# Altium footprint library PCBLIB.PcbLib: 775 footprints (part 47 of 49)
Each footprint in its own frame and in the unit in brackets; x right, y up, seen from the top. Pads: shape width x height; smd on the part's side, far side on the other; paste and mask are expansions set on the pad; w line width, h text height; cw(c..) or ccw(c..) is an arc to the next point about the centre after c.
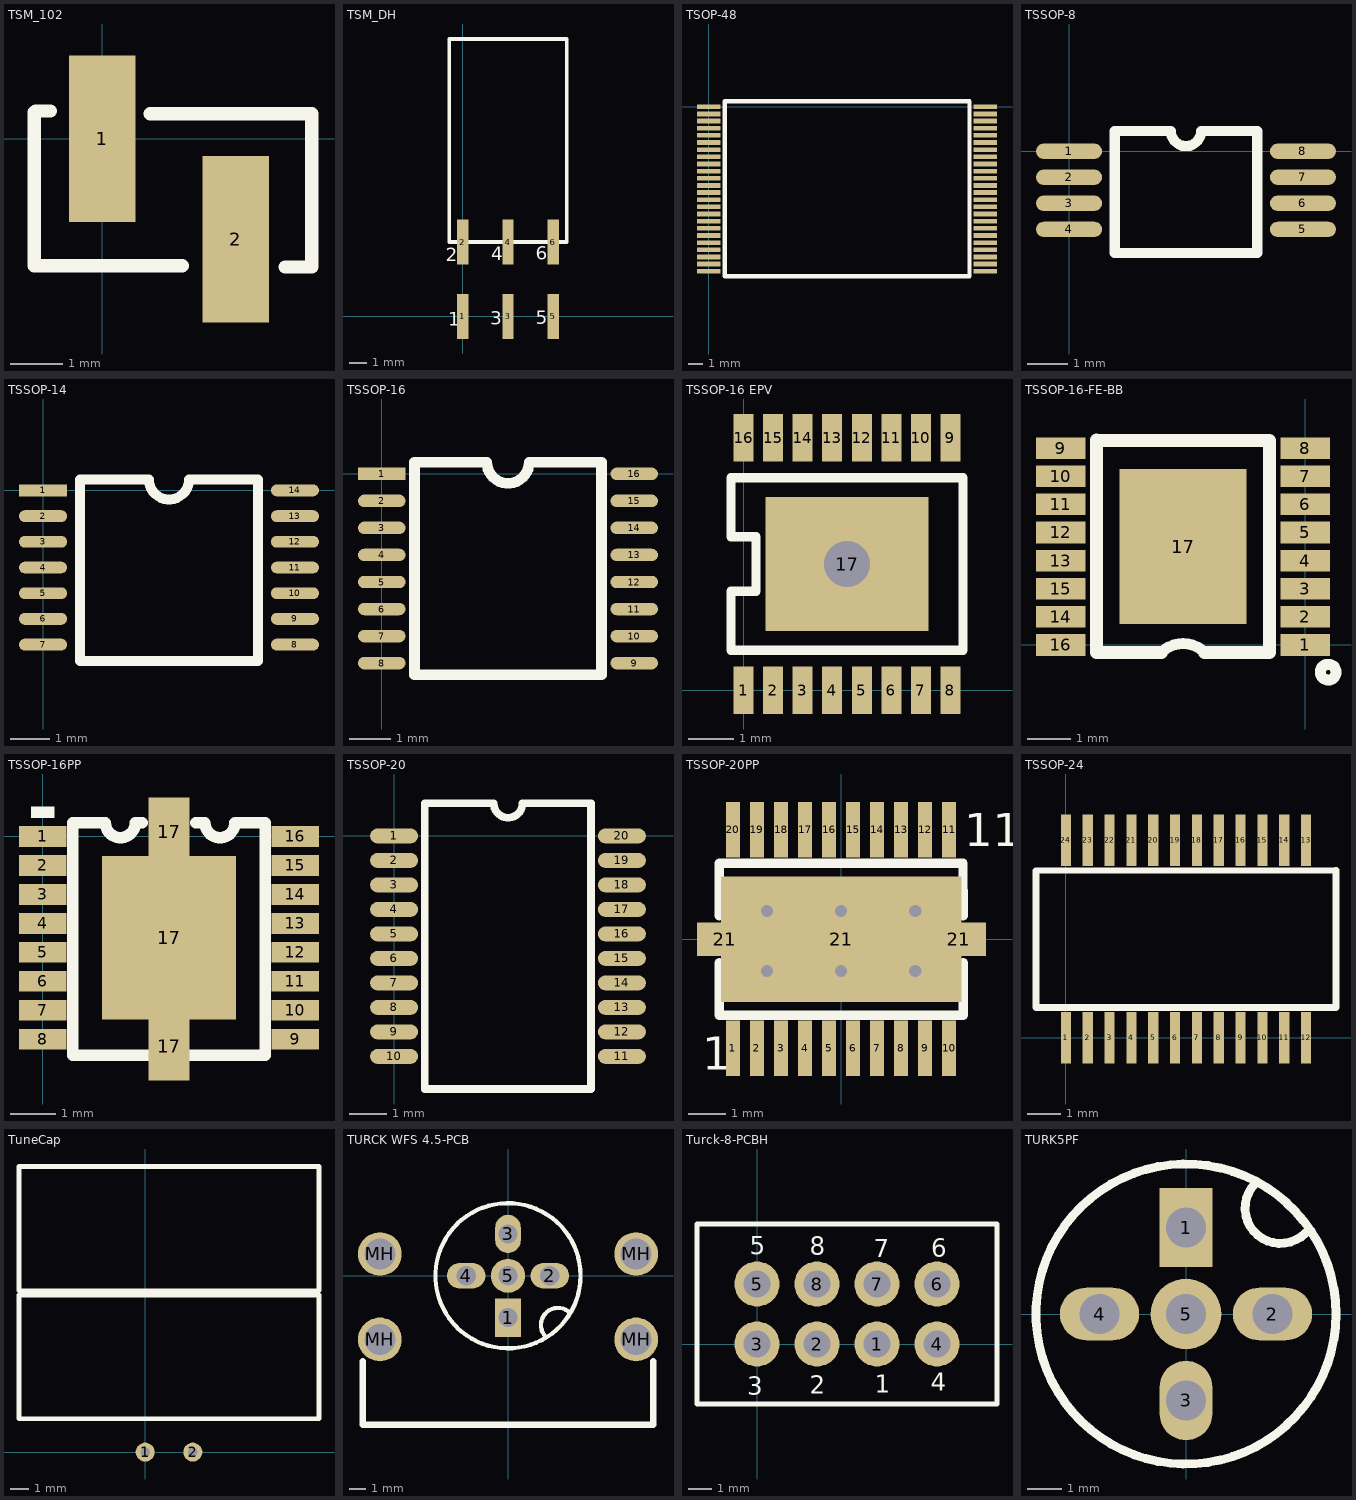
[diagram p46: the footprints below, top view; thin cyan lines are the x and y axes]

## TSM_102 [mm]
height 6.706
pads (2):
  rect 1.27x3.17 smd: 1(0,0) 2(2.54,-1.905)
TopOverlay:
  lines w0.254: -0.991,0.533 -1.27,0.533 -1.295,0.508 -1.295,-2.413 1.524,-2.413 ; 0.914,0.483 3.988,0.483 3.988,-2.438 3.48,-2.438
  text "." at -1.372,1.295 h1.78

## TSM_DH [mil]
height 150
pads (6):
  rect 25x100 smd: 1(0,0) 2(0,165) 3(100,0) 4(100,165) 5(200,0) 6(200,165)
TopOverlay:
  lines w8: -30,165 -30,615 230,615 230,165 -30,165
  text "1" at -32,-20.5 h30
  text "2" at -38,122.5 h30
  text "3" at 61,-18.5 h30
  text "4" at 63,124.5 h30
  text "5" at 161,-17.5 h30
  text "6" at 162,125.5 h30

## TSOP-48 [mil]
height 80
pads (48):
  rect 65x13 smd: 1(0,0) 2(0,-19.68) 3(0,-39.37) 4(0,-59.06) 5(0,-78.74) 6(0,-98.43) 7(0,-118.11) 8(0,-137.8) 9(0,-157.48) 10(0,-177.17) 11(0,-196.85) 12(0,-216.54) 13(0,-236.22) 14(0,-255.91) 15(0,-275.59) 16(0,-295.28) 17(0,-314.96) 18(0,-334.65) 19(0,-354.33) 20(0,-374.02) 21(0,-393.7) 22(0,-413.39) 23(0,-433.07) 24(0,-452.76) 25(760.71,-452.76) 26(760.71,-433.07) 27(760.71,-413.39) 28(760.71,-393.7) 29(760.71,-374.02) 30(760.71,-354.33) 31(760.71,-334.65) 32(760.71,-314.96) 33(760.71,-295.28) 34(760.71,-275.59) 35(760.71,-255.91) 36(760.71,-236.22) 37(760.71,-216.54) 38(760.71,-196.85) 39(760.71,-177.17) 40(760.71,-157.48) 41(760.71,-137.8) 42(760.71,-118.11) 43(760.71,-98.43) 44(760.71,-78.74) 45(760.71,-59.06) 46(760.71,-39.37) 47(760.71,-19.68) 48(760.71,0)
TopOverlay:
  lines w12: 43.52,-466.3 717.52,-466.3 717.52,14.7 43.52,14.7 43.52,-466.3
  text "." at 74.52,-24.3 h80

## TSSOP-8 [mil]
height 45
pads (8):
  oval 65x15 smd mask+2: 1(0,0) 2(0,-25.6) 3(0,-51.2) 4(0,-76.8) 5(230,-76.8) 6(230,-51.2) 7(230,-25.6) 8(230,0)
TopOverlay:
  lines w10: 45,-100 45,20 100,20 ccw(c115,20) 130,20 185,20 185,-100 45,-100

## TSSOP-14 [mil]
height 100
pads (14):
  rect 48x11.8 smd: 1(0,0)
  oval 48x11.8 smd: 2(0,-25.6) 3(0,-51.2) 4(0,-76.8) 5(0,-102.4) 6(0,-128) 7(0,-153.6) 8(251,-153.6) 9(251,-128) 10(251,-102.4) 11(251,-76.8) 12(251,-51.2) 13(251,-25.6) 14(251,0)
TopOverlay:
  lines w10: 37,-170 214,-170 ; 37,-169.6 37,11 105.5,11 ccw(c125.5,11) 145.5,11 214,11 214,-169.6
Mechanical4:
  text ".040" at 0,0 h1

## TSSOP-16 [mil]
height 65
pads (16):
  rect 45x11.8 smd: 1(0,0)
  oval 45x11.8 smd: 2(0,-25.6) 3(0,-51.2) 4(0,-76.8) 5(0,-102.4) 6(0,-128) 7(0,-153.6) 8(0,-179.2) 9(239,-179.2) 10(239,-153.6) 11(239,-128) 12(239,-102.4) 13(239,-76.8) 14(239,-51.2) 15(239,-25.6) 16(239,0)
TopOverlay:
  lines w10: 31,-190 31,11 99.5,11 ccw(c119.5,11) 139.5,11 208,11 208,-190 31,-190
Mechanical4:
  text ".040" at -6,0 h1

## TSSOP-16 EPV [mm]
pads (17):
  rect 0.44x1.05 smd: 1(0,0) 2(0.65,0) 3(1.3,0) 4(1.95,0) 5(2.6,0) 6(3.25,0) 7(3.9,0) 8(4.55,0) 9(4.55,5.55) 10(3.9,5.55) 11(3.25,5.55) 12(2.6,5.55) 13(1.95,5.55) 14(1.3,5.55) 15(0.65,5.55) 16(0,5.55)
  rect 3.58x2.95 hole 1.016: 17(2.275,2.775)
TopOverlay:
  lines w0.203: -0.275,0.875 -0.275,2.175 0.275,2.175 0.275,3.375 -0.275,3.375 -0.275,4.675 4.825,4.675 4.825,0.875 -0.275,0.875
TopPaste:
  rectangle: 0.484,1.295 4.066,4.25

## TSSOP-16-FE-BB [mm]
pads (17):
  rect 1.15x0.5 smd: 1(0,0) 2(0,0.65) 3(0,1.3) 4(0,1.95) 5(0,2.6) 6(0,3.25) 7(0,3.9) 8(0,4.55) 9(-5.65,4.55) 10(-5.65,3.9) 11(-5.65,3.25) 12(-5.65,2.6) 13(-5.65,1.95) 14(-5.65,0.65) 15(-5.65,1.3) 16(-5.65,0)
  rect 2.94x3.58 smd: 17(-2.825,2.276)
TopOverlay:
  circle w0.254: c0.53,-0.628 r0.181
  lines w0.254: -3.325,-0.175 cw(c-2.825,-0.675) -2.325,-0.175
  lines w0.3: -4.826,4.725 -0.824,4.725 -0.824,-0.175 -2.325,-0.175 ; -4.826,4.74 -4.826,-0.175 -3.325,-0.175

## TSSOP-16PP [mil]
height 120
pads (19):
  rect 41x18 smd: 1(0,0) 2(0,-25) 3(0,-50) 4(0,-75) 5(0,-100) 6(0,-125) 7(0,-150) 8(0,-175) 9(218,-175) 10(218,-150) 11(218,-125) 12(218,-100) 13(218,-75) 14(218,-50) 15(218,-25) 16(218,0)
  rect 35.43x59.05 smd: 17(109,-181) 17(109,4)
  rect 115.98x140.98 smd: 17(109.02,-87.48)
TopOverlay:
  rectangle: -10,16 10,26
  lines w10: 86,12 80,12 cw(c67,12) 54,12 26,12 26,-189 192,-189 192,12 166,12 cw(c153,12) 140,12 132,12

## TSSOP-20 [mm]
height 3.048
pads (20):
  oval 1.27x0.4 smd: 1(0,0) 2(0,-0.65) 3(0,-1.3) 4(0,-1.95) 5(0,-2.6) 6(0,-3.25) 7(0,-3.9) 8(0,-4.55) 9(0,-5.2) 10(0,-5.85) 11(6.044,-5.85) 12(6.044,-5.2) 13(6.044,-4.55) 14(6.044,-3.9) 15(6.044,-3.25) 16(6.044,-2.6) 17(6.044,-1.95) 18(6.044,-1.3) 19(6.044,-0.65) 20(6.044,0)
TopOverlay:
  lines w0.203: 0.813,-6.716 0.813,0.864 ; 0.815,-6.716 5.226,-6.716 ; 0.815,0.864 2.645,0.864 ccw(c3.026,0.864) 3.407,0.864 5.226,0.864 ; 5.223,-6.716 5.223,0.864

## TSSOP-20PP [mm] "TI"
height 3.048
pads (23):
  rect 0.38x1.5 smd: 1(-2.927,-2.946) 2(-2.277,-2.946) 3(-1.627,-2.946) 4(-0.977,-2.946) 5(-0.327,-2.946) 6(0.323,-2.946) 7(0.973,-2.946) 8(1.623,-2.946) 9(2.273,-2.946) 10(2.923,-2.946) 11(2.923,2.954) 12(2.273,2.954) 13(1.623,2.954) 14(0.973,2.954) 15(0.323,2.954) 16(-0.327,2.954) 17(-0.977,2.954) 18(-1.627,2.954) 19(-2.277,2.954) 20(-2.927,2.954)
  rect 1.5x0.9 smd: 21(-3.15,0) 21(3.175,0)
  rect 6.5x3.4 smd: 21(0,0)
via 2.007,-0.864 diameter 0.762 hole 0.33
via 2.007,0.762 diameter 0.762 hole 0.33
via 0,-0.864 diameter 0.762 hole 0.33
via 0,0.762 diameter 0.762 hole 0.33
via -2.007,-0.864 diameter 0.762 hole 0.33
via -2.007,0.762 diameter 0.762 hole 0.33
TopOverlay:
  lines w0.254: -3.302,-0.635 -3.302,-2.057 3.298,-2.057 ; -3.302,0.635 -3.302,2.057 3.298,2.057 3.302,0.635 ; 3.302,-2.057 3.302,-0.635
  text "1" at -3.759,-3.531 h0.89
  text "11" at 3.327,2.515 h0.89

## TSSOP-24 [mm]
height 0.127
pads (24):
  rect 0.3x1.524 smd: 1(0,0) 2(0.65,0) 3(1.3,0) 4(1.95,0) 5(2.6,0) 6(3.25,0) 7(3.9,0) 8(4.55,0) 9(5.2,0) 10(5.85,0) 11(6.5,0) 12(7.15,0) 13(7.15,5.88) 14(6.5,5.88) 15(5.85,5.88) 16(5.2,5.88) 17(4.55,5.88) 18(3.9,5.88) 19(3.25,5.88) 20(2.6,5.88) 21(1.95,5.88) 22(1.3,5.88) 23(0.65,5.88) 24(0,5.88)
TopOverlay:
  lines w0.203: 8.039,4.984 8.039,0.902 -0.889,0.902 -0.889,4.973 8.039,4.986
  text "." at 0.113,1.318 h1.52

## TuneCap [mil]
pads (2):
  round 40 hole 20: 1(0,0) 2(100,0)
TopOverlay:
  lines w10: -265,70 365,70 365,330 -265,330 -265,70 ; -265,339 365,339 365,600 -265,600 -265,339

## TURCK WFS 4.5-PCB [mil]
pads (9):
  rect 60x90 hole 45: 1(0,-97.99)
  oval 90x60 hole 45: 2(97.99,0) 4(-97.99,0)
  oval 60x90 hole 45: 3(0,98)
  round 80 hole 45: 5(0,0)
  round 102.36 hole 73: MH(-300,-149) MH(-300,51) MH(300,-149) MH(300,51)
TopOverlay:
  circle w10: c0,0 r170
  lines w10: 88.94,-143.47 cw(c117.22,-115.19) 145.5,-86.91
  lines w15: -340,-200 -340,-349 340,-349 340,-200
Mechanical4:
  text "1.083" at 0,0 h1
  text "1.370" at -98,0 h1

## Turck-8-PCBH [mil] "90degree Turck Connector"
height 10
pads (8):
  round 75 hole 45: 1(200,0) 2(100,0) 3(0,0) 4(300,0) 5(0,100) 6(300,100) 7(200,100) 8(100,100)
TopOverlay:
  lines w8: -100,-100 400,-100 400,200 -100,200 -100,-100
  text "8" at 88.11,148.58 h30
  text "7" at 194.99,144.36 h30
  text "6" at 290.62,145.77 h30
  text "5" at -11.74,149.99 h30
  text "4" at 289.21,-77.83 h30
  text "3" at -16.27,-84.38 h30
  text "2" at 87.64,-82.63 h30
  text "1" at 195.92,-80.89 h30

## TURK5PF [mil]
pads (5):
  rect 60x90 hole 45: 1(0,98)
  oval 90x60 hole 45: 2(98,0) 4(-98,0)
  oval 60x90 hole 45: 3(0,-98)
  round 80 hole 45: 5(0,0)
TopOverlay:
  circle w10: c0,0 r170
  lines w10: 78.72,148.28 ccw(c107,120) 135.28,91.72
Mechanical4:
  text "1.370" at 0,98 h1
  text "1.083" at 0,0 h1